# Altium footprint library 3M THD.PcbLib: 163 footprints (part 10 of 14) (continued)
## 3M_N3432-6203RB_a [mm] "3M, 3000 Series, 40 Contacts - Pitch 2.54mm - Straight Four-Wall Header (Black) With Short Roll Pin and Latch/Ejectors Installed, Solder Tail 3.94mm" (continued)
  text "40" at 25.365,1.727 h1
  text "1" at -26,-1.2 h1
3D body "3M_N3432-6203RB_a.stp": height 24.64, standoff -3.94, extent -35.052,-4.318 35.052,4.318

## 3M_N3432-6302RB [mm] "3M, 3000 Series, 40 Contacts - Pitch 2.54mm - Straight Four-Wall Header (Black) With Long Roll Pin and Latch/Ejectors Installed"
height 27.2
pads (42):
  round 1.6 hole 0.9: 1(-24.13,-1.27) 2(-24.13,1.27) 3(-21.59,-1.27) 4(-21.59,1.27) 5(-19.05,-1.27) 6(-19.05,1.27) 7(-16.51,-1.27) 8(-16.51,1.27) 9(-13.97,-1.27) 10(-13.97,1.27) 11(-11.43,-1.27) 12(-11.43,1.27) 13(-8.89,-1.27) 14(-8.89,1.27) 15(-6.35,-1.27) 16(-6.35,1.27) 17(-3.81,-1.27) 18(-3.81,1.27) 19(-1.27,-1.27) 20(-1.27,1.27) 21(1.27,-1.27) 22(1.27,1.27) 23(3.81,-1.27) 24(3.81,1.27) 25(6.35,-1.27) 26(6.35,1.27) 27(8.89,-1.27) 28(8.89,1.27) 29(11.43,-1.27) 30(11.43,1.27) 31(13.97,-1.27) 32(13.97,1.27) 33(16.51,-1.27) 34(16.51,1.27) 35(19.05,-1.27) 36(19.05,1.27) 37(21.59,-1.27) 38(21.59,1.27) 39(24.13,-1.27) 40(24.13,1.27)
  round 4.6 hole 2.8: MTG1(-33.07,-0.25) MTG2(33.07,-0.25)
Top Overlay:
  lines w0.2: -35.052,-2.102 -35.052,-4.318 35.052,-4.318 35.052,-2.102 ; -35.052,1.704 -35.052,4.304 ; -35.052,4.318 35.052,4.318 ; -2.032,-4.318 -2.032,-3.175 ; 2.032,-4.318 2.032,-3.175 ; 35.052,1.704 35.052,4.304 ; -28.067,-3.175 28.067,-3.175 28.067,3.175 -28.067,3.175 -28.067,-3.175 ; -25.4,-3.175 -22.86,-3.175 -24.13,-4.318 -25.4,-3.175
  text "1" at -25.992,-2.446 h1
  text "40" at 25.365,1.727 h1
Mechanical 8:
  drawing of 172 lines, arcs and shapes, not listed
Mechanical 14:
  circle w0.1: c-33.084,-0.254 r1.27
  circle w0.1: c33.084,-0.254 r1.27
  lines w0.1: -35.052,-3.175 -31.724,-3.175 ; -35.052,3.175 -31.724,3.175 ; -31.724,-4.318 -31.724,-1.727 -24.765,-1.727 -24.765,1.27 -31.724,1.27 -31.724,4.318 ; -30.882,-4.318 -30.882,-1.727 ; -30.882,1.27 -30.882,4.318 ; -28.448,-4.318 -28.448,-1.727 ; -28.448,1.27 -28.448,4.318 ; -28.067,-1.727 -28.067,-3.175 28.067,-3.175 28.067,-1.727 ; -28.067,1.27 -28.067,3.175 28.067,3.175 28.067,1.27 ; -27.606,-4.318 -27.606,-3.175 ; -27.606,3.175 -27.606,4.318 ; -27.164,-4.318 -27.164,-3.175 ; -27.164,3.175 -27.164,4.318 ; -25.913,-4.318 -25.913,-3.175 ; -25.913,3.175 -25.913,4.318 ; -21.279,-4.318 -21.279,-3.175 ; -19.361,-4.318 -19.361,-3.175 ; -2.032,-4.318 -2.032,-3.175 ; 2.032,-4.318 2.032,-3.175 ; 21.901,-4.318 21.901,-3.175 ; 23.819,-4.318 23.819,-3.175 ; 25.913,-4.318 25.913,-3.175 ; 25.913,3.175 25.913,4.318 ; 27.164,-4.318 27.164,-3.175 ; 27.164,3.175 27.164,4.318 ; 27.606,-4.318 27.606,-3.175 ; 27.606,3.175 27.606,4.318 ; 28.493,1.27 28.493,4.318 ; 30.882,-4.318 30.882,-1.727 ; 30.882,1.27 30.882,4.318 ; 31.724,-4.318 31.724,-1.727 24.765,-1.727 24.765,1.27 31.724,1.27 31.724,4.318 ; 31.724,-3.175 35.052,-3.175 ; 31.724,3.175 35.052,3.175 ; -35.052,-4.318 35.052,-4.318 35.052,4.318 -35.052,4.318 -35.052,-4.318 ; -34.608,-1.134 -33.084,-2.014 -31.56,-1.134 -31.56,0.626 -33.084,1.506 -34.608,0.626 -34.608,-1.134 ; 31.56,-1.134 33.084,-2.014 34.608,-1.134 34.608,0.626 33.084,1.506 31.56,0.626 31.56,-1.134
  text "1" at -26,-1.2 h1
  text "40" at 25.365,1.727 h1
3D body "3M_N3432-6302RB.stp": height 19.96, standoff -2.84, extent -46.178,-4.318 46.18,4.318

## 3M_N3432-6302RB_a [mm] "3M, 3000 Series, 40 Contacts - Pitch 2.54mm - Straight Four-Wall Header (Black) With Long Roll Pin and Latch/Ejectors Installed"
height 27.2
pads (42):
  round 1.6 hole 0.9: 1(-24.13,-1.27) 2(-24.13,1.27) 3(-21.59,-1.27) 4(-21.59,1.27) 5(-19.05,-1.27) 6(-19.05,1.27) 7(-16.51,-1.27) 8(-16.51,1.27) 9(-13.97,-1.27) 10(-13.97,1.27) 11(-11.43,-1.27) 12(-11.43,1.27) 13(-8.89,-1.27) 14(-8.89,1.27) 15(-6.35,-1.27) 16(-6.35,1.27) 17(-3.81,-1.27) 18(-3.81,1.27) 19(-1.27,-1.27) 20(-1.27,1.27) 21(1.27,-1.27) 22(1.27,1.27) 23(3.81,-1.27) 24(3.81,1.27) 25(6.35,-1.27) 26(6.35,1.27) 27(8.89,-1.27) 28(8.89,1.27) 29(11.43,-1.27) 30(11.43,1.27) 31(13.97,-1.27) 32(13.97,1.27) 33(16.51,-1.27) 34(16.51,1.27) 35(19.05,-1.27) 36(19.05,1.27) 37(21.59,-1.27) 38(21.59,1.27) 39(24.13,-1.27) 40(24.13,1.27)
  round 4.6 hole 2.8: MTG1(-33.07,-0.25) MTG2(33.07,-0.25)
Top Overlay:
  lines w0.2: -35.052,-2.102 -35.052,-4.318 35.052,-4.318 35.052,-2.102 ; -35.052,1.704 -35.052,4.304 ; -35.052,4.318 35.052,4.318 ; -2.032,-4.318 -2.032,-3.175 ; 2.032,-4.318 2.032,-3.175 ; 35.052,1.704 35.052,4.304 ; -28.067,-3.175 28.067,-3.175 28.067,3.175 -28.067,3.175 -28.067,-3.175 ; -25.4,-3.175 -22.86,-3.175 -24.13,-4.318 -25.4,-3.175
  text "1" at -25.992,-2.446 h1
  text "40" at 25.365,1.727 h1
Mechanical 8:
  drawing of 172 lines, arcs and shapes, not listed
Mechanical 14:
  circle w0.1: c-33.084,-0.254 r1.27
  circle w0.1: c33.084,-0.254 r1.27
  lines w0.1: -35.052,-3.175 -31.724,-3.175 ; -35.052,3.175 -31.724,3.175 ; -31.724,-4.318 -31.724,-1.727 -24.765,-1.727 -24.765,1.27 -31.724,1.27 -31.724,4.318 ; -30.882,-4.318 -30.882,-1.727 ; -30.882,1.27 -30.882,4.318 ; -28.448,-4.318 -28.448,-1.727 ; -28.448,1.27 -28.448,4.318 ; -28.067,-1.727 -28.067,-3.175 28.067,-3.175 28.067,-1.727 ; -28.067,1.27 -28.067,3.175 28.067,3.175 28.067,1.27 ; -27.606,-4.318 -27.606,-3.175 ; -27.606,3.175 -27.606,4.318 ; -27.164,-4.318 -27.164,-3.175 ; -27.164,3.175 -27.164,4.318 ; -25.913,-4.318 -25.913,-3.175 ; -25.913,3.175 -25.913,4.318 ; -21.279,-4.318 -21.279,-3.175 ; -19.361,-4.318 -19.361,-3.175 ; -2.032,-4.318 -2.032,-3.175 ; 2.032,-4.318 2.032,-3.175 ; 21.901,-4.318 21.901,-3.175 ; 23.819,-4.318 23.819,-3.175 ; 25.913,-4.318 25.913,-3.175 ; 25.913,3.175 25.913,4.318 ; 27.164,-4.318 27.164,-3.175 ; 27.164,3.175 27.164,4.318 ; 27.606,-4.318 27.606,-3.175 ; 27.606,3.175 27.606,4.318 ; 28.493,1.27 28.493,4.318 ; 30.882,-4.318 30.882,-1.727 ; 30.882,1.27 30.882,4.318 ; 31.724,-4.318 31.724,-1.727 24.765,-1.727 24.765,1.27 31.724,1.27 31.724,4.318 ; 31.724,-3.175 35.052,-3.175 ; 31.724,3.175 35.052,3.175 ; -35.052,-4.318 35.052,-4.318 35.052,4.318 -35.052,4.318 -35.052,-4.318 ; -34.608,-1.134 -33.084,-2.014 -31.56,-1.134 -31.56,0.626 -33.084,1.506 -34.608,0.626 -34.608,-1.134 ; 31.56,-1.134 33.084,-2.014 34.608,-1.134 34.608,0.626 33.084,1.506 31.56,0.626 31.56,-1.134
  text "1" at -26,-1.2 h1
  text "40" at 25.365,1.727 h1
3D body "3M_N3432-6302RB_a.stp": height 27.18, standoff -2.84, extent -35.052,-4.318 35.052,4.318

## 3M_N3433-5302RB [mm] "3M, 3000 Series, 50 Contacts - Pitch 2.54mm - Right Angle Four-Wall Header (Black) With Long Roll Pin Latch/Ejectors"
height 8.6
pads (52):
  round 1.6 hole 0.9: 1(-30.48,-1.27) 2(-30.48,1.27) 3(-27.94,-1.27) 4(-27.94,1.27) 5(-25.4,-1.27) 6(-25.4,1.27) 7(-22.86,-1.27) 8(-22.86,1.27) 9(-20.32,-1.27) 10(-20.32,1.27) 11(-17.78,-1.27) 12(-17.78,1.27) 13(-15.24,-1.27) 14(-15.24,1.27) 15(-12.7,-1.27) 16(-12.7,1.27) 17(-10.16,-1.27) 18(-10.16,1.27) 19(-7.62,-1.27) 20(-7.62,1.27) 21(-5.08,-1.27) 22(-5.08,1.27) 23(-2.54,-1.27) 24(-2.54,1.27) 25(0,-1.27) 26(0,1.27) 27(2.54,-1.27) 28(2.54,1.27) 29(5.08,-1.27) 30(5.08,1.27) 31(7.62,-1.27) 32(7.62,1.27) 33(10.16,-1.27) 34(10.16,1.27) 35(12.7,-1.27) 36(12.7,1.27) 37(15.24,-1.27) 38(15.24,1.27) 39(17.78,-1.27) 40(17.78,1.27) 41(20.32,-1.27) 42(20.32,1.27) 43(22.86,-1.27) 44(22.86,1.27) 45(25.4,-1.27) 46(25.4,1.27) 47(27.94,-1.27) 48(27.94,1.27) 49(30.48,-1.27) 50(30.48,1.27)
  round 4.6 hole 2.8: MTG1(-36.386,0.533) MTG2(36.386,0.533)
Top Overlay:
  circle w0.2: c36.068,6.375 r0.953
  circle w0.2: c-36.068,6.375 r0.953
  circle w0.2: c-30.553,-3.048 r0.15
  lines w0.2: -47.005,11.145 -44.427,15.611 ccw(c-44.515,15.662) -44.464,15.75 -47.378,17.432 -52.484,14.485 ccw(c-52.433,14.397) -52.484,14.309 -43.297,9.005 -40.985,6.25 ; -45.392,13.939 -39.438,10.502 ; -37.785,-2.007 -38.91,-2.007 cw(c-39.422,-2.007) -39.934,-2.007 -41.402,-2.007 -41.402,5.105 -38.074,14.249 -37.232,14.249 ccw(c-36.068,14.757) -34.798,14.757 -33.956,14.757 -33.514,12.251 ccw(c-32.263,12.471) -32.263,11.201 32.263,11.201 ccw(c32.263,12.471) 33.514,12.251 33.956,14.757 34.798,14.757 ccw(c36.068,14.757) 37.232,14.249 38.074,14.249 41.402,5.105 41.402,-2.007 39.954,-2.007 cw(c39.445,-2.007) 38.936,-2.007 37.785,-2.007 ; -30.169,11.201 -30.169,9.931 -29.861,9.931 ; -28.251,11.201 -28.251,9.931 -29.861,9.931 ; -2.019,5.105 2.032,5.105 ; -2.019,11.201 -2.019,3.581 2.032,3.581 2.032,11.201 ; -0.318,5.105 -0.318,11.201 0.318,11.201 0.318,5.105 ; 25.718,11.201 25.711,9.931 27.623,9.931 27.629,11.201 -31.667,11.201 -30.397,9.002 -29.861,9.931 ; 39.438,10.502 45.392,13.939 ; 40.985,6.25 43.297,9.005 52.484,14.309 ccw(c52.433,14.397) 52.484,14.485 47.378,17.432 44.464,15.75 ccw(c44.515,15.662) 44.427,15.611 47.005,11.145
  text "1" at -32.512,-1.7 h1.02
  text "50" at 29.845,2.667 h1.02
Mechanical 8:
  drawing of 212 lines, arcs and shapes, not listed
Mechanical 14:
  circle w0.1: c36.068,6.375 r0.953
  circle w0.1: c-36.068,6.375 r0.953
  lines w0.1: -47.005,11.145 -44.427,15.611 ccw(c-44.515,15.662) -44.464,15.75 -47.378,17.432 -52.484,14.485 ccw(c-52.433,14.397) -52.484,14.309 -43.297,9.005 -40.985,6.25 ; -45.392,13.939 -39.438,10.502 ; -38.887,-2.007 -38.887,1.978 -36.386,3.422 -33.884,1.978 -33.846,-2.006 ; -30.169,11.201 -30.169,9.931 -29.861,9.931 ; -28.251,11.201 -28.251,9.931 -29.861,9.931 ; -2.019,5.105 2.032,5.105 ; -2.019,11.201 -2.019,3.581 2.032,3.581 2.032,11.201 ; -0.318,5.105 -0.318,11.201 0.318,11.201 0.318,5.105 ; 25.718,11.201 25.711,9.931 27.623,9.931 27.629,11.201 -31.667,11.201 -30.397,9.002 -29.861,9.931 ; 33.884,-2.007 33.884,1.978 36.386,3.422 38.887,1.978 38.926,-2.006 ; 39.438,10.502 45.392,13.939 ; 40.985,6.25 43.297,9.005 52.484,14.309 ccw(c52.433,14.397) 52.484,14.485 47.378,17.432 44.464,15.75 ccw(c44.515,15.662) 44.427,15.611 47.005,11.145 ; -41.402,-2.007 -39.934,-2.007 ccw(c-39.422,-2.007) -38.91,-2.007 -6.858,-2.007 ccw(c-6.35,-2.007) -5.842,-2.007 5.842,-2.007 ccw(c6.35,-2.007) 6.858,-2.007 38.936,-2.007 ccw(c39.445,-2.007) 39.954,-2.007 41.402,-2.007 41.402,5.105 38.074,14.249 37.232,14.249 cw(c36.068,14.757) 34.798,14.757 33.956,14.757 33.514,12.251 cw(c32.263,12.471) 32.263,11.201 -32.263,11.201 cw(c-32.263,12.471) -33.514,12.251 -33.956,14.757 -34.798,14.757 cw(c-36.068,14.757) -37.232,14.249 -38.074,14.249 -41.402,5.105 -41.402,-2.007
  text "1" at -32.512,-1.7 h1.02
  text "50" at 29.845,2.667 h1.02
3D body "3M_N3433-5302RB.stp": height 8.64, standoff -2.84, extent -52.528,-2.514 52.529,17.448

## 3M_N3433-5302RB_a [mm] "3M, 3000 Series, 50 Contacts - Pitch 2.54mm - Right Angle Four-Wall Header (Black) With Long Roll Pin Latch/Ejectors"
height 8.6
pads (52):
  round 1.6 hole 0.9: 1(-30.48,-1.27) 2(-30.48,1.27) 3(-27.94,-1.27) 4(-27.94,1.27) 5(-25.4,-1.27) 6(-25.4,1.27) 7(-22.86,-1.27) 8(-22.86,1.27) 9(-20.32,-1.27) 10(-20.32,1.27) 11(-17.78,-1.27) 12(-17.78,1.27) 13(-15.24,-1.27) 14(-15.24,1.27) 15(-12.7,-1.27) 16(-12.7,1.27) 17(-10.16,-1.27) 18(-10.16,1.27) 19(-7.62,-1.27) 20(-7.62,1.27) 21(-5.08,-1.27) 22(-5.08,1.27) 23(-2.54,-1.27) 24(-2.54,1.27) 25(0,-1.27) 26(0,1.27) 27(2.54,-1.27) 28(2.54,1.27) 29(5.08,-1.27) 30(5.08,1.27) 31(7.62,-1.27) 32(7.62,1.27) 33(10.16,-1.27) 34(10.16,1.27) 35(12.7,-1.27) 36(12.7,1.27) 37(15.24,-1.27) 38(15.24,1.27) 39(17.78,-1.27) 40(17.78,1.27) 41(20.32,-1.27) 42(20.32,1.27) 43(22.86,-1.27) 44(22.86,1.27) 45(25.4,-1.27) 46(25.4,1.27) 47(27.94,-1.27) 48(27.94,1.27) 49(30.48,-1.27) 50(30.48,1.27)
  round 4.6 hole 2.8: MTG1(-36.386,0.533) MTG2(36.386,0.533)
Top Overlay:
  circle w0.2: c36.068,6.375 r0.953
  circle w0.2: c-36.068,6.375 r0.953
  circle w0.2: c-30.553,-3.048 r0.15
  lines w0.2: -37.785,-2.007 -38.91,-2.007 cw(c-39.422,-2.007) -39.934,-2.007 -41.402,-2.007 -41.402,5.105 -38.074,14.249 -37.232,14.249 ccw(c-36.068,14.757) -34.798,14.757 -33.956,14.757 -33.514,12.251 ccw(c-32.263,12.471) -32.263,11.201 32.263,11.201 ccw(c32.263,12.471) 33.514,12.251 33.956,14.757 34.798,14.757 ccw(c36.068,14.757) 37.232,14.249 38.074,14.249 41.402,5.105 41.402,-2.007 39.954,-2.007 cw(c39.445,-2.007) 38.936,-2.007 37.785,-2.007 ; -37.389,14.249 -37.389,24.561 cw(c-37.287,24.561) -37.236,24.649 -32.131,21.702 -32.131,18.336 cw(c-32.233,18.336) -32.233,18.235 -37.389,18.235 ; -34.163,14.757 -34.163,22.875 ; -30.169,11.201 -30.169,9.931 -29.861,9.931 ; -28.251,11.201 -28.251,9.931 -29.861,9.931 ; -2.019,5.105 2.032,5.105 ; -2.019,11.201 -2.019,3.581 2.032,3.581 2.032,11.201 ; -0.318,5.105 -0.318,11.201 0.318,11.201 0.318,5.105 ; 25.718,11.201 25.711,9.931 27.623,9.931 27.629,11.201 -31.667,11.201 -30.397,9.002 -29.861,9.931 ; 34.163,14.757 34.163,22.875 ; 37.389,14.249 37.389,24.561 ccw(c37.287,24.561) 37.236,24.649 32.131,21.702 32.131,18.336 ccw(c32.233,18.336) 32.233,18.235 37.389,18.235
  text "1" at -32.512,-1.7 h1.02
  text "50" at 29.845,2.667 h1.02
Mechanical 8:
  drawing of 212 lines, arcs and shapes, not listed
Mechanical 14:
  circle w0.1: c36.068,6.375 r0.953
  circle w0.1: c-36.068,6.375 r0.953
  lines w0.1: -38.887,-2.007 -38.887,1.978 -36.386,3.422 -33.884,1.978 -33.846,-2.006 ; -37.389,14.249 -37.389,24.561 cw(c-37.287,24.561) -37.236,24.649 -32.131,21.702 -32.131,18.336 cw(c-32.233,18.336) -32.233,18.235 -37.389,18.235 ; -34.163,14.757 -34.163,22.875 ; -30.169,11.201 -30.169,9.931 -29.861,9.931 ; -28.251,11.201 -28.251,9.931 -29.861,9.931 ; -2.019,5.105 2.032,5.105 ; -2.019,11.201 -2.019,3.581 2.032,3.581 2.032,11.201 ; -0.318,5.105 -0.318,11.201 0.318,11.201 0.318,5.105 ; 25.718,11.201 25.711,9.931 27.623,9.931 27.629,11.201 -31.667,11.201 -30.397,9.002 -29.861,9.931 ; 33.884,-2.007 33.884,1.978 36.386,3.422 38.887,1.978 38.926,-2.006 ; 34.163,14.757 34.163,22.875 ; 37.389,14.249 37.389,24.561 ccw(c37.287,24.561) 37.236,24.649 32.131,21.702 32.131,18.336 ccw(c32.233,18.336) 32.233,18.235 37.389,18.235 ; -41.402,-2.007 -39.934,-2.007 ccw(c-39.422,-2.007) -38.91,-2.007 -6.858,-2.007 ccw(c-6.35,-2.007) -5.842,-2.007 5.842,-2.007 ccw(c6.35,-2.007) 6.858,-2.007 38.936,-2.007 ccw(c39.445,-2.007) 39.954,-2.007 41.402,-2.007 41.402,5.105 38.074,14.249 37.232,14.249 cw(c36.068,14.757) 34.798,14.757 33.956,14.757 33.514,12.251 cw(c32.263,12.471) 32.263,11.201 -32.263,11.201 cw(c-32.263,12.471) -33.514,12.251 -33.956,14.757 -34.798,14.757 cw(c-36.068,14.757) -37.232,14.249 -38.074,14.249 -41.402,5.105 -41.402,-2.007
  text "1" at -32.512,-1.7 h1.02
  text "50" at 29.845,2.667 h1.02
3D body "3M_N3433-5302RB_a.stp": height 8.64, standoff -2.84, extent -41.402,-2.514 41.402,24.663

## 3M_N3433-6002RB [mm] "3M, 3000 Series, 50 Contacts - Pitch 2.54mm - Straight Four-Wall Header (Black) Without Latch/Ejectors"
height 17.3
pads (52):
  round 1.6 hole 0.9: 1(-30.48,-1.27) 2(-30.48,1.27) 3(-27.94,-1.27) 4(-27.94,1.27) 5(-25.4,-1.27) 6(-25.4,1.27) 7(-22.86,-1.27) 8(-22.86,1.27) 9(-20.32,-1.27) 10(-20.32,1.27) 11(-17.78,-1.27) 12(-17.78,1.27) 13(-15.24,-1.27) 14(-15.24,1.27) 15(-12.7,-1.27) 16(-12.7,1.27) 17(-10.16,-1.27) 18(-10.16,1.27) 19(-7.62,-1.27) 20(-7.62,1.27) 21(-5.08,-1.27) 22(-5.08,1.27) 23(-2.54,-1.27) 24(-2.54,1.27) 25(0,-1.27) 26(0,1.27) 27(2.54,-1.27) 28(2.54,1.27) 29(5.08,-1.27) 30(5.08,1.27) 31(7.62,-1.27) 32(7.62,1.27) 33(10.16,-1.27) 34(10.16,1.27) 35(12.7,-1.27) 36(12.7,1.27) 37(15.24,-1.27) 38(15.24,1.27) 39(17.78,-1.27) 40(17.78,1.27) 41(20.32,-1.27) 42(20.32,1.27) 43(22.86,-1.27) 44(22.86,1.27) 45(25.4,-1.27) 46(25.4,1.27) 47(27.94,-1.27) 48(27.94,1.27) 49(30.48,-1.27) 50(30.48,1.27)
  round 4.6 hole 2.6: MTG1(-39.42,-0.254) MTG2(39.42,-0.254)
Top Overlay:
  lines w0.2: -41.402,-2 -41.402,-4.318 41.402,-4.318 41.402,-2 ; -41.402,1.7 -41.402,4.3 41.402,4.3 41.402,1.7 ; -1.964,-4.318 -1.964,-3.175 ; 2.1,-4.318 2.1,-3.175 ; -34.417,-3.175 -34.417,3.175 34.417,3.175 34.417,-3.175 -34.417,-3.175 ; -31.75,-3.175 -30.48,-4.318 -29.21,-3.175 -31.75,-3.175
  text "1" at -32.817,-2.921 h1.02
  text "50" at 31.715,1.727 h1.02
Mechanical 8:
  drawing of 212 lines, arcs and shapes, not listed
Mechanical 14:
  circle w0.1: c39.434,-0.254 r1.27
  circle w0.1: c-39.434,-0.254 r1.27
  lines w0.1: -41.402,-3.175 -38.074,-3.175 ; -40.434,-0.254 -39.434,-0.254 ; -39.434,-1.254 -39.434,-0.254 ; -39.434,0.746 -39.434,-0.254 ; -38.434,-0.254 -39.434,-0.254 ; -38.074,-4.318 -38.074,-1.727 -31.115,-1.727 -31.115,1.27 -38.074,1.27 -38.074,4.318 ; -37.232,-4.318 -37.232,-1.727 ; -37.232,1.27 -37.232,4.318 ; -34.799,-4.318 -34.798,-1.727 ; -34.417,-1.727 -34.417,-3.175 ; -34.417,1.27 -34.417,3.175 ; -27.629,-4.318 -27.629,-3.175 ; -25.711,-4.318 -25.711,-3.175 ; -2.032,-4.318 -2.032,-3.175 ; 2.032,-4.318 2.032,-3.175 ; 28.251,-4.318 28.251,-3.175 ; 30.169,-4.318 30.169,-3.175 ; 33.956,-4.318 33.956,-3.175 ; 33.956,3.175 33.956,4.318 ; 34.417,-1.727 34.417,-3.175 ; 34.417,1.27 34.417,3.175 ; 34.798,1.27 34.798,4.318 ; 34.839,-4.318 34.839,-1.727 ; 37.232,-4.318 37.232,-1.727 ; 37.232,1.27 37.232,4.318 ; 38.074,-4.318 38.074,-1.727 31.115,-1.727 31.115,1.27 38.074,1.27 38.074,4.318 ; 38.074,-3.175 41.402,-3.175 ; 38.074,3.175 41.402,3.175 ; 38.434,-0.254 39.434,-0.254 ; 39.434,-1.254 39.434,-0.254 ; 39.434,0.746 39.434,-0.254 ; 40.434,-0.254 39.434,-0.254 ; -41.402,-4.318 41.402,-4.318 41.402,4.318 -41.402,4.318 ; -41.402,-4.318 -41.402,4.318 ; -41.402,-4.318 -41.402,4.318 ; -34.417,-3.175 34.417,-3.175 ; -34.417,-3.175 -34.417,3.175 ; -34.417,3.175 34.417,3.175 ; 34.417,-3.175 34.417,3.175 ; -41.402,3.175 -38.074,3.175 -41.402,3.175 ; -40.958,-1.134 -40.958,0.626 -39.434,1.506 -37.91,0.626 -37.91,-1.134 -39.434,-2.014 -40.958,-1.134 ; -34.798,1.27 -34.798,4.318 -34.798,1.27 ; -33.956,-4.318 -33.956,-3.175 -33.956,-4.318 ; -33.956,3.175 -33.956,4.318 -33.956,3.175 ; 37.91,-1.134 37.91,0.626 39.434,1.506 40.958,0.626 40.958,-1.134 39.434,-2.014 37.91,-1.134
  text "50" at 31.715,1.727 h1.02
  text "1" at -32.817,-2.921 h1.02
3D body "3M_N3433_6002RB.stp": height 17.27, standoff -2.84, extent -41.402,-4.318 41.402,4.318

## 3M_N3433-6202RB [mm] "3M, 3000 Series, 50 Contacts - Pitch 2.54mm - Straight Four-Wall Header (Black) With Short Roll Pin Latch/Ejectors"
height 24.6
pads (52):
  round 1.6 hole 0.9: 1(-30.48,-1.27) 2(-30.48,1.27) 3(-27.94,-1.27) 4(-27.94,1.27) 5(-25.4,-1.27) 6(-25.4,1.27) 7(-22.86,-1.27) 8(-22.86,1.27) 9(-20.32,-1.27) 10(-20.32,1.27) 11(-17.78,-1.27) 12(-17.78,1.27) 13(-15.24,-1.27) 14(-15.24,1.27) 15(-12.7,-1.27) 16(-12.7,1.27) 17(-10.16,-1.27) 18(-10.16,1.27) 19(-7.62,-1.27) 20(-7.62,1.27) 21(-5.08,-1.27) 22(-5.08,1.27) 23(-2.54,-1.27) 24(-2.54,1.27) 25(0,-1.27) 26(0,1.27) 27(2.54,-1.27) 28(2.54,1.27) 29(5.08,-1.27) 30(5.08,1.27) 31(7.62,-1.27) 32(7.62,1.27) 33(10.16,-1.27) 34(10.16,1.27) 35(12.7,-1.27) 36(12.7,1.27) 37(15.24,-1.27) 38(15.24,1.27) 39(17.78,-1.27) 40(17.78,1.27) 41(20.32,-1.27) 42(20.32,1.27) 43(22.86,-1.27) 44(22.86,1.27) 45(25.4,-1.27) 46(25.4,1.27) 47(27.94,-1.27) 48(27.94,1.27) 49(30.48,-1.27) 50(30.48,1.27)
  round 4.6 hole 2.6: MTG1(-39.42,-0.254) MTG2(39.42,-0.254)
Top Overlay:
  lines w0.2: -41.402,-2 -41.402,-4.318 41.402,-4.318 41.402,-2 ; -41.402,1.7 -41.402,4.3 41.402,4.3 41.402,1.7 ; -1.964,-4.318 -1.964,-3.175 ; 2.1,-4.318 2.1,-3.175 ; -34.417,-3.175 -34.417,3.175 34.417,3.175 34.417,-3.175 -34.417,-3.175 ; -31.75,-3.175 -30.48,-4.318 -29.21,-3.175 -31.75,-3.175
  text "1" at -32.817,-2.921 h1.02
  text "50" at 31.715,1.727 h1.02
Mechanical 8:
  drawing of 212 lines, arcs and shapes, not listed
Mechanical 14:
  circle w0.1: c39.434,-0.254 r1.27
  circle w0.1: c-39.434,-0.254 r1.27
  lines w0.1: -41.402,-3.175 -38.074,-3.175 ; -40.434,-0.254 -39.434,-0.254 ; -39.434,-1.254 -39.434,-0.254 ; -39.434,0.746 -39.434,-0.254 ; -38.434,-0.254 -39.434,-0.254 ; -38.074,-4.318 -38.074,-1.727 -31.115,-1.727 -31.115,1.27 -38.074,1.27 -38.074,4.318 ; -37.232,-4.318 -37.232,-1.727 ; -37.232,1.27 -37.232,4.318 ; -34.799,-4.318 -34.798,-1.727 ; -34.417,-1.727 -34.417,-3.175 ; -34.417,1.27 -34.417,3.175 ; -27.629,-4.318 -27.629,-3.175 ; -25.711,-4.318 -25.711,-3.175 ; -2.032,-4.318 -2.032,-3.175 ; 2.032,-4.318 2.032,-3.175 ; 28.251,-4.318 28.251,-3.175 ; 30.169,-4.318 30.169,-3.175 ; 33.956,-4.318 33.956,-3.175 ; 33.956,3.175 33.956,4.318 ; 34.417,-1.727 34.417,-3.175 ; 34.417,1.27 34.417,3.175 ; 34.798,1.27 34.798,4.318 ; 34.839,-4.318 34.839,-1.727 ; 37.232,-4.318 37.232,-1.727 ; 37.232,1.27 37.232,4.318 ; 38.074,-4.318 38.074,-1.727 31.115,-1.727 31.115,1.27 38.074,1.27 38.074,4.318 ; 38.074,-3.175 41.402,-3.175 ; 38.074,3.175 41.402,3.175 ; 38.434,-0.254 39.434,-0.254 ; 39.434,-1.254 39.434,-0.254 ; 39.434,0.746 39.434,-0.254 ; 40.434,-0.254 39.434,-0.254 ; -41.402,-4.318 41.402,-4.318 41.402,4.318 -41.402,4.318 ; -41.402,-4.318 -41.402,4.318 ; -41.402,-4.318 -41.402,4.318 ; -34.417,-3.175 34.417,-3.175 ; -34.417,-3.175 -34.417,3.175 ; -34.417,3.175 34.417,3.175 ; 34.417,-3.175 34.417,3.175 ; -41.402,3.175 -38.074,3.175 -41.402,3.175 ; -40.958,-1.134 -40.958,0.626 -39.434,1.506 -37.91,0.626 -37.91,-1.134 -39.434,-2.014 -40.958,-1.134 ; -34.798,1.27 -34.798,4.318 -34.798,1.27 ; -33.956,-4.318 -33.956,-3.175 -33.956,-4.318 ; -33.956,3.175 -33.956,4.318 -33.956,3.175 ; 37.91,-1.134 37.91,0.626 39.434,1.506 40.958,0.626 40.958,-1.134 39.434,-2.014 37.91,-1.134
  text "50" at 31.715,1.727 h1.02
  text "1" at -32.817,-2.921 h1.02
3D body "3M_N3433_6202RB.stp": height 18.69, standoff -2.84, extent -50.331,-4.318 50.331,4.318

## 3M_N3433-6202RB_a [mm] "3M, 3000 Series, 50 Contacts - Pitch 2.54mm - Straight Four-Wall Header (Black) With Short Roll Pin Latch/Ejectors"
height 24.6
pads (52):
  round 1.6 hole 0.9: 1(-30.48,-1.27) 2(-30.48,1.27) 3(-27.94,-1.27) 4(-27.94,1.27) 5(-25.4,-1.27) 6(-25.4,1.27) 7(-22.86,-1.27) 8(-22.86,1.27) 9(-20.32,-1.27) 10(-20.32,1.27) 11(-17.78,-1.27) 12(-17.78,1.27) 13(-15.24,-1.27) 14(-15.24,1.27) 15(-12.7,-1.27) 16(-12.7,1.27) 17(-10.16,-1.27) 18(-10.16,1.27) 19(-7.62,-1.27) 20(-7.62,1.27) 21(-5.08,-1.27) 22(-5.08,1.27) 23(-2.54,-1.27) 24(-2.54,1.27) 25(0,-1.27) 26(0,1.27) 27(2.54,-1.27) 28(2.54,1.27) 29(5.08,-1.27) 30(5.08,1.27) 31(7.62,-1.27) 32(7.62,1.27) 33(10.16,-1.27) 34(10.16,1.27) 35(12.7,-1.27) 36(12.7,1.27) 37(15.24,-1.27) 38(15.24,1.27) 39(17.78,-1.27) 40(17.78,1.27) 41(20.32,-1.27) 42(20.32,1.27) 43(22.86,-1.27) 44(22.86,1.27) 45(25.4,-1.27) 46(25.4,1.27) 47(27.94,-1.27) 48(27.94,1.27) 49(30.48,-1.27) 50(30.48,1.27)
  round 4.6 hole 2.6: MTG1(-39.42,-0.254) MTG2(39.42,-0.254)
Top Overlay:
  lines w0.2: -41.402,-2 -41.402,-4.318 41.402,-4.318 41.402,-2 ; -41.402,1.7 -41.402,4.3 41.402,4.3 41.402,1.7 ; -1.964,-4.318 -1.964,-3.175 ; 2.1,-4.318 2.1,-3.175 ; -34.417,-3.175 -34.417,3.175 34.417,3.175 34.417,-3.175 -34.417,-3.175 ; -31.75,-3.175 -30.48,-4.318 -29.21,-3.175 -31.75,-3.175
  text "1" at -32.817,-2.921 h1.02
  text "50" at 31.715,1.727 h1.02
Mechanical 8:
  drawing of 212 lines, arcs and shapes, not listed
Mechanical 14:
  circle w0.1: c39.434,-0.254 r1.27
  circle w0.1: c-39.434,-0.254 r1.27
  lines w0.1: -41.402,-3.175 -38.074,-3.175 ; -40.434,-0.254 -39.434,-0.254 ; -39.434,-1.254 -39.434,-0.254 ; -39.434,0.746 -39.434,-0.254 ; -38.434,-0.254 -39.434,-0.254 ; -38.074,-4.318 -38.074,-1.727 -31.115,-1.727 -31.115,1.27 -38.074,1.27 -38.074,4.318 ; -37.232,-4.318 -37.232,-1.727 ; -37.232,1.27 -37.232,4.318 ; -34.799,-4.318 -34.798,-1.727 ; -34.417,-1.727 -34.417,-3.175 ; -34.417,1.27 -34.417,3.175 ; -27.629,-4.318 -27.629,-3.175 ; -25.711,-4.318 -25.711,-3.175 ; -2.032,-4.318 -2.032,-3.175 ; 2.032,-4.318 2.032,-3.175 ; 28.251,-4.318 28.251,-3.175 ; 30.169,-4.318 30.169,-3.175 ; 33.956,-4.318 33.956,-3.175 ; 33.956,3.175 33.956,4.318 ; 34.417,-1.727 34.417,-3.175 ; 34.417,1.27 34.417,3.175 ; 34.798,1.27 34.798,4.318 ; 34.839,-4.318 34.839,-1.727 ; 37.232,-4.318 37.232,-1.727 ; 37.232,1.27 37.232,4.318 ; 38.074,-4.318 38.074,-1.727 31.115,-1.727 31.115,1.27 38.074,1.27 38.074,4.318 ; 38.074,-3.175 41.402,-3.175 ; 38.074,3.175 41.402,3.175 ; 38.434,-0.254 39.434,-0.254 ; 39.434,-1.254 39.434,-0.254 ; 39.434,0.746 39.434,-0.254 ; 40.434,-0.254 39.434,-0.254 ; -41.402,-4.318 41.402,-4.318 41.402,4.318 -41.402,4.318 ; -41.402,-4.318 -41.402,4.318 ; -41.402,-4.318 -41.402,4.318 ; -34.417,-3.175 34.417,-3.175 ; -34.417,-3.175 -34.417,3.175 ; -34.417,3.175 34.417,3.175 ; 34.417,-3.175 34.417,3.175 ; -41.402,3.175 -38.074,3.175 -41.402,3.175 ; -40.958,-1.134 -40.958,0.626 -39.434,1.506 -37.91,0.626 -37.91,-1.134 -39.434,-2.014 -40.958,-1.134 ; -34.798,1.27 -34.798,4.318 -34.798,1.27 ; -33.956,-4.318 -33.956,-3.175 -33.956,-4.318 ; -33.956,3.175 -33.956,4.318 -33.956,3.175 ; 37.91,-1.134 37.91,0.626 39.434,1.506 40.958,0.626 40.958,-1.134 39.434,-2.014 37.91,-1.134
  text "50" at 31.715,1.727 h1.02
  text "1" at -32.817,-2.921 h1.02
3D body "3M_N3433_6202RB_a.stp": height 24.64, standoff -2.84, extent -41.402,-4.318 41.402,4.318